# Altium footprint library con-samtec.PCBLIB: 805 footprints (part 50 of 55)
Each footprint in its own frame and in the unit in brackets; x right, y up, seen from the top. Pads: shape width x height; smd on the part's side, far side on the other; paste and mask are expansions set on the pad; w line width, h text height; cw(c..) or ccw(c..) is an arc to the next point about the centre after c.
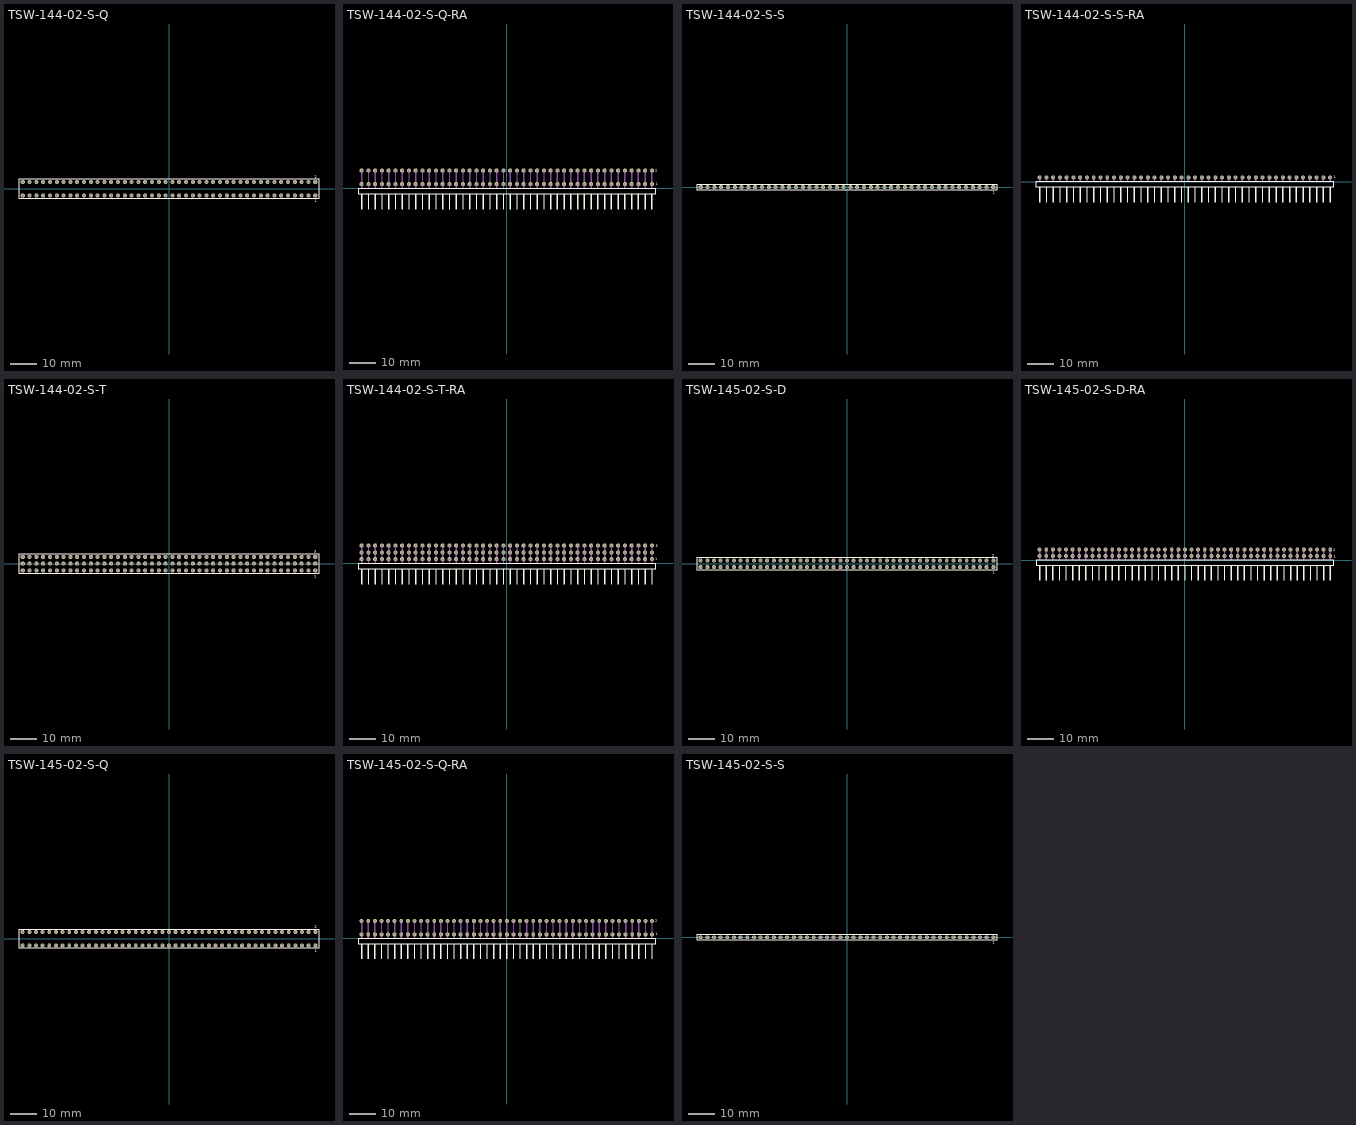
[diagram p49: the footprints below, top view; thin cyan lines are the x and y axes]

## TSW-144-02-S-Q [mm]
pads (88):
  oct 1.5x1.5 hole 1: 1(54.61,-2.54) 2(54.61,2.54) 3(52.07,-2.54) 4(52.07,2.54) 5(49.53,-2.54) 6(49.53,2.54) 7(46.99,-2.54) 8(46.99,2.54) 9(44.45,-2.54) 10(44.45,2.54) 11(41.91,-2.54) 12(41.91,2.54) 13(39.37,-2.54) 14(39.37,2.54) 15(36.83,-2.54) 16(36.83,2.54) 17(34.29,-2.54) 18(34.29,2.54) 19(31.75,-2.54) 20(31.75,2.54) 21(29.21,-2.54) 22(29.21,2.54) 23(26.67,-2.54) 24(26.67,2.54) 25(24.13,-2.54) 26(24.13,2.54) 27(21.59,-2.54) 28(21.59,2.54) 29(19.05,-2.54) 30(19.05,2.54) 31(16.51,-2.54) 32(16.51,2.54) 33(13.97,-2.54) 34(13.97,2.54) 35(11.43,-2.54) 36(11.43,2.54) 37(8.89,-2.54) 38(8.89,2.54) 39(6.35,-2.54) 40(6.35,2.54) 41(3.81,-2.54) 42(3.81,2.54) 43(1.27,-2.54) 44(1.27,2.54) 45(-1.27,-2.54) 46(-1.27,2.54) 47(-3.81,-2.54) 48(-3.81,2.54) 49(-6.35,-2.54) 50(-6.35,2.54) 51(-8.89,-2.54) 52(-8.89,2.54) 53(-11.43,-2.54) 54(-11.43,2.54) 55(-13.97,-2.54) 56(-13.97,2.54) 57(-16.51,-2.54) 58(-16.51,2.54) 59(-19.05,-2.54) 60(-19.05,2.54) 61(-21.59,-2.54) 62(-21.59,2.54) 63(-24.13,-2.54) 64(-24.13,2.54) 65(-26.67,-2.54) 66(-26.67,2.54) 67(-29.21,-2.54) 68(-29.21,2.54) 69(-31.75,-2.54) 70(-31.75,2.54) 71(-34.29,-2.54) 72(-34.29,2.54) 73(-36.83,-2.54) 74(-36.83,2.54) 75(-39.37,-2.54) 76(-39.37,2.54) 77(-41.91,-2.54) 78(-41.91,2.54) 79(-44.45,-2.54) 80(-44.45,2.54) 81(-46.99,-2.54) 82(-46.99,2.54) 83(-49.53,-2.54) 84(-49.53,2.54) 85(-52.07,-2.54) 86(-52.07,2.54) 87(-54.61,-2.54) 88(-54.61,2.54)
Top Overlay:
  lines w0.203: -56.009,-3.695 56.009,-3.695 56.009,3.695 -56.009,3.695 -56.009,-3.695
  text "1" at 54.452,-5.138 h0.94
  text "2" at 54.352,3.989 h0.94
Mechanical 16:
  rectangle: -54.96,-2.89 -54.26,-2.19
  rectangle: -54.96,2.19 -54.26,2.89
  rectangle: -52.42,-2.89 -51.72,-2.19
  rectangle: -52.42,2.19 -51.72,2.89
  rectangle: -49.88,-2.89 -49.18,-2.19
  rectangle: -49.88,2.19 -49.18,2.89
  rectangle: -47.34,-2.89 -46.64,-2.19
  rectangle: -47.34,2.19 -46.64,2.89
  rectangle: -44.8,-2.89 -44.1,-2.19
  rectangle: -44.8,2.19 -44.1,2.89
  rectangle: -42.26,-2.89 -41.56,-2.19
  rectangle: -42.26,2.19 -41.56,2.89
  rectangle: -39.72,-2.89 -39.02,-2.19
  rectangle: -39.72,2.19 -39.02,2.89
  rectangle: -37.18,-2.89 -36.48,-2.19
  rectangle: -37.18,2.19 -36.48,2.89
  rectangle: -34.64,-2.89 -33.94,-2.19
  rectangle: -34.64,2.19 -33.94,2.89
  rectangle: -32.1,-2.89 -31.4,-2.19
  rectangle: -32.1,2.19 -31.4,2.89
  rectangle: -29.56,-2.89 -28.86,-2.19
  rectangle: -29.56,2.19 -28.86,2.89
  rectangle: -27.02,-2.89 -26.32,-2.19
  rectangle: -27.02,2.19 -26.32,2.89
  rectangle: -24.48,-2.89 -23.78,-2.19
  rectangle: -24.48,2.19 -23.78,2.89
  rectangle: -21.94,-2.89 -21.24,-2.19
  rectangle: -21.94,2.19 -21.24,2.89
  rectangle: -19.4,-2.89 -18.7,-2.19
  rectangle: -19.4,2.19 -18.7,2.89
  rectangle: -16.86,-2.89 -16.16,-2.19
  rectangle: -16.86,2.19 -16.16,2.89
  rectangle: -14.32,-2.89 -13.62,-2.19
  rectangle: -14.32,2.19 -13.62,2.89
  rectangle: -11.78,-2.89 -11.08,-2.19
  rectangle: -11.78,2.19 -11.08,2.89
  rectangle: -9.24,-2.89 -8.54,-2.19
  rectangle: -9.24,2.19 -8.54,2.89
  rectangle: -6.7,-2.89 -6,-2.19
  rectangle: -6.7,2.19 -6,2.89
  rectangle: -4.16,-2.89 -3.46,-2.19
  rectangle: -4.16,2.19 -3.46,2.89
  rectangle: -1.62,-2.89 -0.92,-2.19
  rectangle: -1.62,2.19 -0.92,2.89
  rectangle: 0.92,-2.89 1.62,-2.19
  rectangle: 0.92,2.19 1.62,2.89
  rectangle: 3.46,-2.89 4.16,-2.19
  rectangle: 3.46,2.19 4.16,2.89
  rectangle: 6,-2.89 6.7,-2.19
  rectangle: 6,2.19 6.7,2.89
  rectangle: 8.54,-2.89 9.24,-2.19
  rectangle: 8.54,2.19 9.24,2.89
  rectangle: 11.08,-2.89 11.78,-2.19
  rectangle: 11.08,2.19 11.78,2.89
  rectangle: 13.62,-2.89 14.32,-2.19
  rectangle: 13.62,2.19 14.32,2.89
  rectangle: 16.16,-2.89 16.86,-2.19
  rectangle: 16.16,2.19 16.86,2.89
  rectangle: 18.7,-2.89 19.4,-2.19
  rectangle: 18.7,2.19 19.4,2.89
  rectangle: 21.24,-2.89 21.94,-2.19
  rectangle: 21.24,2.19 21.94,2.89
  rectangle: 23.78,-2.89 24.48,-2.19
  rectangle: 23.78,2.19 24.48,2.89
  rectangle: 26.32,-2.89 27.02,-2.19
  rectangle: 26.32,2.19 27.02,2.89
  rectangle: 28.86,-2.89 29.56,-2.19
  rectangle: 28.86,2.19 29.56,2.89
  rectangle: 31.4,-2.89 32.1,-2.19
  rectangle: 31.4,2.19 32.1,2.89
  rectangle: 33.94,-2.89 34.64,-2.19
  rectangle: 33.94,2.19 34.64,2.89
  rectangle: 36.48,-2.89 37.18,-2.19
  rectangle: 36.48,2.19 37.18,2.89
  rectangle: 39.02,-2.89 39.72,-2.19
  rectangle: 39.02,2.19 39.72,2.89
  rectangle: 41.56,-2.89 42.26,-2.19
  rectangle: 41.56,2.19 42.26,2.89
  rectangle: 44.1,-2.89 44.8,-2.19
  rectangle: 44.1,2.19 44.8,2.89
  rectangle: 46.64,-2.89 47.34,-2.19
  rectangle: 46.64,2.19 47.34,2.89
  rectangle: 49.18,-2.89 49.88,-2.19
  rectangle: 49.18,2.19 49.88,2.89
  rectangle: 51.72,-2.89 52.42,-2.19
  rectangle: 51.72,2.19 52.42,2.89
  rectangle: 54.26,-2.89 54.96,-2.19
  rectangle: 54.26,2.19 54.96,2.89

## TSW-144-02-S-Q-RA [mil]
pads (88):
  oct 59.06x59.06 hole 39.37: 1(2150,60) 2(2150,260) 3(2050,60) 4(2050,260) 5(1950,60) 6(1950,260) 7(1850,60) 8(1850,260) 9(1750,60) 10(1750,260) 11(1650,60) 12(1650,260) 13(1550,60) 14(1550,260) 15(1450,60) 16(1450,260) 17(1350,60) 18(1350,260) 19(1250,60) 20(1250,260) 21(1150,60) 22(1150,260) 23(1050,60) 24(1050,260) 25(950,60) 26(950,260) 27(850,60) 28(850,260) 29(750,60) 30(750,260) 31(650,60) 32(650,260) 33(550,60) 34(550,260) 35(450,60) 36(450,260) 37(350,60) 38(350,260) 39(250,60) 40(250,260) 41(150,60) 42(150,260) 43(50,60) 44(50,260) 45(-50,60) 46(-50,260) 47(-150,60) 48(-150,260) 49(-250,60) 50(-250,260) 51(-350,60) 52(-350,260) 53(-450,60) 54(-450,260) 55(-550,60) 56(-550,260) 57(-650,60) 58(-650,260) 59(-750,60) 60(-750,260) 61(-850,60) 62(-850,260) 63(-950,60) 64(-950,260) 65(-1050,60) 66(-1050,260) 67(-1150,60) 68(-1150,260) 69(-1250,60) 70(-1250,260) 71(-1350,60) 72(-1350,260) 73(-1450,60) 74(-1450,260) 75(-1550,60) 76(-1550,260) 77(-1650,60) 78(-1650,260) 79(-1750,60) 80(-1750,260) 81(-1850,60) 82(-1850,260) 83(-1950,60) 84(-1950,260) 85(-2050,60) 86(-2050,260) 87(-2150,60) 88(-2150,260)
Top Overlay:
  rectangle: -2160,-310.63 -2140,-80.32
  rectangle: -2060,-310.63 -2040,-80.32
  rectangle: -1960,-310.63 -1940,-80.32
  rectangle: -1860,-310.63 -1840,-80.32
  rectangle: -1760,-310.63 -1740,-80.32
  rectangle: -1660,-310.63 -1640,-80.32
  rectangle: -1560,-310.63 -1540,-80.32
  rectangle: -1460,-310.63 -1440,-80.32
  rectangle: -1360,-310.63 -1340,-80.32
  rectangle: -1260,-310.63 -1240,-80.32
  rectangle: -1160,-310.63 -1140,-80.32
  rectangle: -1060,-310.63 -1040,-80.32
  rectangle: -960,-310.63 -940,-80.32
  rectangle: -860,-310.63 -840,-80.32
  rectangle: -760,-310.63 -740,-80.32
  rectangle: -660,-310.63 -640,-80.32
  rectangle: -560,-310.63 -540,-80.32
  rectangle: -460,-310.63 -440,-80.32
  rectangle: -360,-310.63 -340,-80.32
  rectangle: -260,-310.63 -240,-80.32
  rectangle: -160,-310.63 -140,-80.32
  rectangle: -60,-310.63 -40,-80.32
  rectangle: 40,-310.63 60,-80.32
  rectangle: 140,-310.63 160,-80.32
  rectangle: 240,-310.63 260,-80.32
  rectangle: 340,-310.63 360,-80.32
  rectangle: 440,-310.63 460,-80.32
  rectangle: 540,-310.63 560,-80.32
  rectangle: 640,-310.63 660,-80.32
  rectangle: 740,-310.63 760,-80.32
  rectangle: 840,-310.63 860,-80.32
  rectangle: 940,-310.63 960,-80.32
  rectangle: 1040,-310.63 1060,-80.32
  rectangle: 1140,-310.63 1160,-80.32
  rectangle: 1240,-310.63 1260,-80.32
  rectangle: 1340,-310.63 1360,-80.32
  rectangle: 1440,-310.63 1460,-80.32
  rectangle: 1540,-310.63 1560,-80.32
  rectangle: 1640,-310.63 1660,-80.32
  rectangle: 1740,-310.63 1760,-80.32
  rectangle: 1840,-310.63 1860,-80.32
  rectangle: 1940,-310.63 1960,-80.32
  rectangle: 2040,-310.63 2060,-80.32
  rectangle: 2140,-310.63 2160,-80.32
  lines w8: -2205.08,-80.55 2205.08,-80.55 2205.08,-4.17 -2205.08,-4.17 -2205.08,-80.55
  text "1" at 2203.54,43.31 h36.81
  text "2" at 2201.18,242.72 h36.81
Mechanical 16:
  rectangle: -2160,0 -2140,270
  rectangle: -2060,0 -2040,270
  rectangle: -1960,0 -1940,270
  rectangle: -1860,0 -1840,270
  rectangle: -1760,0 -1740,270
  rectangle: -1660,0 -1640,270
  rectangle: -1560,0 -1540,270
  rectangle: -1460,0 -1440,270
  rectangle: -1360,0 -1340,270
  rectangle: -1260,0 -1240,270
  rectangle: -1160,0 -1140,270
  rectangle: -1060,0 -1040,270
  rectangle: -960,0 -940,270
  rectangle: -860,0 -840,270
  rectangle: -760,0 -740,270
  rectangle: -660,0 -640,270
  rectangle: -560,0 -540,270
  rectangle: -460,0 -440,270
  rectangle: -360,0 -340,270
  rectangle: -260,0 -240,270
  rectangle: -160,0 -140,270
  rectangle: -60,0 -40,270
  rectangle: 40,0 60,270
  rectangle: 140,0 160,270
  rectangle: 240,0 260,270
  rectangle: 340,0 360,270
  rectangle: 440,0 460,270
  rectangle: 540,0 560,270
  rectangle: 640,0 660,270
  rectangle: 740,0 760,270
  rectangle: 840,0 860,270
  rectangle: 940,0 960,270
  rectangle: 1040,0 1060,270
  rectangle: 1140,0 1160,270
  rectangle: 1240,0 1260,270
  rectangle: 1340,0 1360,270
  rectangle: 1440,0 1460,270
  rectangle: 1540,0 1560,270
  rectangle: 1640,0 1660,270
  rectangle: 1740,0 1760,270
  rectangle: 1840,0 1860,270
  rectangle: 1940,0 1960,270
  rectangle: 2040,0 2060,270
  rectangle: 2140,0 2160,270

## TSW-144-02-S-S [mm]
pads (44):
  oct 1.5x1.5 hole 1: 1(54.61,0) 2(52.07,0) 3(49.53,0) 4(46.99,0) 5(44.45,0) 6(41.91,0) 7(39.37,0) 8(36.83,0) 9(34.29,0) 10(31.75,0) 11(29.21,0) 12(26.67,0) 13(24.13,0) 14(21.59,0) 15(19.05,0) 16(16.51,0) 17(13.97,0) 18(11.43,0) 19(8.89,0) 20(6.35,0) 21(3.81,0) 22(1.27,0) 23(-1.27,0) 24(-3.81,0) 25(-6.35,0) 26(-8.89,0) 27(-11.43,0) 28(-13.97,0) 29(-16.51,0) 30(-19.05,0) 31(-21.59,0) 32(-24.13,0) 33(-26.67,0) 34(-29.21,0) 35(-31.75,0) 36(-34.29,0) 37(-36.83,0) 38(-39.37,0) 39(-41.91,0) 40(-44.45,0) 41(-46.99,0) 42(-49.53,0) 43(-52.07,0) 44(-54.61,0)
Top Overlay:
  lines w0.203: -56.009,-1.155 56.009,-1.155 56.009,1.155 -56.009,1.155 -56.009,-1.155
  text "1" at 54.352,-2.498 h0.94
Mechanical 16:
  rectangle: -54.96,-0.35 -54.26,0.35
  rectangle: -52.42,-0.35 -51.72,0.35
  rectangle: -49.88,-0.35 -49.18,0.35
  rectangle: -47.34,-0.35 -46.64,0.35
  rectangle: -44.8,-0.35 -44.1,0.35
  rectangle: -42.26,-0.35 -41.56,0.35
  rectangle: -39.72,-0.35 -39.02,0.35
  rectangle: -37.18,-0.35 -36.48,0.35
  rectangle: -34.64,-0.35 -33.94,0.35
  rectangle: -32.1,-0.35 -31.4,0.35
  rectangle: -29.56,-0.35 -28.86,0.35
  rectangle: -27.02,-0.35 -26.32,0.35
  rectangle: -24.48,-0.35 -23.78,0.35
  rectangle: -21.94,-0.35 -21.24,0.35
  rectangle: -19.4,-0.35 -18.7,0.35
  rectangle: -16.86,-0.35 -16.16,0.35
  rectangle: -14.32,-0.35 -13.62,0.35
  rectangle: -11.78,-0.35 -11.08,0.35
  rectangle: -9.24,-0.35 -8.54,0.35
  rectangle: -6.7,-0.35 -6,0.35
  rectangle: -4.16,-0.35 -3.46,0.35
  rectangle: -1.62,-0.35 -0.92,0.35
  rectangle: 0.92,-0.35 1.62,0.35
  rectangle: 3.46,-0.35 4.16,0.35
  rectangle: 6,-0.35 6.7,0.35
  rectangle: 8.54,-0.35 9.24,0.35
  rectangle: 11.08,-0.35 11.78,0.35
  rectangle: 13.62,-0.35 14.32,0.35
  rectangle: 16.16,-0.35 16.86,0.35
  rectangle: 18.7,-0.35 19.4,0.35
  rectangle: 21.24,-0.35 21.94,0.35
  rectangle: 23.78,-0.35 24.48,0.35
  rectangle: 26.32,-0.35 27.02,0.35
  rectangle: 28.86,-0.35 29.56,0.35
  rectangle: 31.4,-0.35 32.1,0.35
  rectangle: 33.94,-0.35 34.64,0.35
  rectangle: 36.48,-0.35 37.18,0.35
  rectangle: 39.02,-0.35 39.72,0.35
  rectangle: 41.56,-0.35 42.26,0.35
  rectangle: 44.1,-0.35 44.8,0.35
  rectangle: 46.64,-0.35 47.34,0.35
  rectangle: 49.18,-0.35 49.88,0.35
  rectangle: 51.72,-0.35 52.42,0.35
  rectangle: 54.26,-0.35 54.96,0.35

## TSW-144-02-S-S-RA [mil]
pads (44):
  oct 59.06x59.06 hole 39.37: 1(2150,60) 2(2050,60) 3(1950,60) 4(1850,60) 5(1750,60) 6(1650,60) 7(1550,60) 8(1450,60) 9(1350,60) 10(1250,60) 11(1150,60) 12(1050,60) 13(950,60) 14(850,60) 15(750,60) 16(650,60) 17(550,60) 18(450,60) 19(350,60) 20(250,60) 21(150,60) 22(50,60) 23(-50,60) 24(-150,60) 25(-250,60) 26(-350,60) 27(-450,60) 28(-550,60) 29(-650,60) 30(-750,60) 31(-850,60) 32(-950,60) 33(-1050,60) 34(-1150,60) 35(-1250,60) 36(-1350,60) 37(-1450,60) 38(-1550,60) 39(-1650,60) 40(-1750,60) 41(-1850,60) 42(-1950,60) 43(-2050,60) 44(-2150,60)
Top Overlay:
  rectangle: -2160,-310.63 -2140,-80.32
  rectangle: -2060,-310.63 -2040,-80.32
  rectangle: -1960,-310.63 -1940,-80.32
  rectangle: -1860,-310.63 -1840,-80.32
  rectangle: -1760,-310.63 -1740,-80.32
  rectangle: -1660,-310.63 -1640,-80.32
  rectangle: -1560,-310.63 -1540,-80.32
  rectangle: -1460,-310.63 -1440,-80.32
  rectangle: -1360,-310.63 -1340,-80.32
  rectangle: -1260,-310.63 -1240,-80.32
  rectangle: -1160,-310.63 -1140,-80.32
  rectangle: -1060,-310.63 -1040,-80.32
  rectangle: -960,-310.63 -940,-80.32
  rectangle: -860,-310.63 -840,-80.32
  rectangle: -760,-310.63 -740,-80.32
  rectangle: -660,-310.63 -640,-80.32
  rectangle: -560,-310.63 -540,-80.32
  rectangle: -460,-310.63 -440,-80.32
  rectangle: -360,-310.63 -340,-80.32
  rectangle: -260,-310.63 -240,-80.32
  rectangle: -160,-310.63 -140,-80.32
  rectangle: -60,-310.63 -40,-80.32
  rectangle: 40,-310.63 60,-80.32
  rectangle: 140,-310.63 160,-80.32
  rectangle: 240,-310.63 260,-80.32
  rectangle: 340,-310.63 360,-80.32
  rectangle: 440,-310.63 460,-80.32
  rectangle: 540,-310.63 560,-80.32
  rectangle: 640,-310.63 660,-80.32
  rectangle: 740,-310.63 760,-80.32
  rectangle: 840,-310.63 860,-80.32
  rectangle: 940,-310.63 960,-80.32
  rectangle: 1040,-310.63 1060,-80.32
  rectangle: 1140,-310.63 1160,-80.32
  rectangle: 1240,-310.63 1260,-80.32
  rectangle: 1340,-310.63 1360,-80.32
  rectangle: 1440,-310.63 1460,-80.32
  rectangle: 1540,-310.63 1560,-80.32
  rectangle: 1640,-310.63 1660,-80.32
  rectangle: 1740,-310.63 1760,-80.32
  rectangle: 1840,-310.63 1860,-80.32
  rectangle: 1940,-310.63 1960,-80.32
  rectangle: 2040,-310.63 2060,-80.32
  rectangle: 2140,-310.63 2160,-80.32
  lines w8: -2205.08,-80.55 2205.08,-80.55 2205.08,-4.17 -2205.08,-4.17 -2205.08,-80.55
  text "1" at 2200.47,45.35 h36.81
Mechanical 16:
  rectangle: -2160,0 -2140,70
  rectangle: -2060,0 -2040,70
  rectangle: -1960,0 -1940,70
  rectangle: -1860,0 -1840,70
  rectangle: -1760,0 -1740,70
  rectangle: -1660,0 -1640,70
  rectangle: -1560,0 -1540,70
  rectangle: -1460,0 -1440,70
  rectangle: -1360,0 -1340,70
  rectangle: -1260,0 -1240,70
  rectangle: -1160,0 -1140,70
  rectangle: -1060,0 -1040,70
  rectangle: -960,0 -940,70
  rectangle: -860,0 -840,70
  rectangle: -760,0 -740,70
  rectangle: -660,0 -640,70
  rectangle: -560,0 -540,70
  rectangle: -460,0 -440,70
  rectangle: -360,0 -340,70
  rectangle: -260,0 -240,70
  rectangle: -160,0 -140,70
  rectangle: -60,0 -40,70
  rectangle: 40,0 60,70
  rectangle: 140,0 160,70
  rectangle: 240,0 260,70
  rectangle: 340,0 360,70
  rectangle: 440,0 460,70
  rectangle: 540,0 560,70
  rectangle: 640,0 660,70
  rectangle: 740,0 760,70
  rectangle: 840,0 860,70
  rectangle: 940,0 960,70
  rectangle: 1040,0 1060,70
  rectangle: 1140,0 1160,70
  rectangle: 1240,0 1260,70
  rectangle: 1340,0 1360,70
  rectangle: 1440,0 1460,70
  rectangle: 1540,0 1560,70
  rectangle: 1640,0 1660,70
  rectangle: 1740,0 1760,70
  rectangle: 1840,0 1860,70
  rectangle: 1940,0 1960,70
  rectangle: 2040,0 2060,70
  rectangle: 2140,0 2160,70

## TSW-144-02-S-T [mm]
pads (132):
  oct 1.5x1.5 hole 1: 1(54.61,-2.54) 2(54.61,0) 3(54.61,2.54) 4(52.07,-2.54) 5(52.07,0) 6(52.07,2.54) 7(49.53,-2.54) 8(49.53,0) 9(49.53,2.54) 10(46.99,-2.54) 11(46.99,0) 12(46.99,2.54) 13(44.45,-2.54) 14(44.45,0) 15(44.45,2.54) 16(41.91,-2.54) 17(41.91,0) 18(41.91,2.54) 19(39.37,-2.54) 20(39.37,0) 21(39.37,2.54) 22(36.83,-2.54) 23(36.83,0) 24(36.83,2.54) 25(34.29,-2.54) 26(34.29,0) 27(34.29,2.54) 28(31.75,-2.54) 29(31.75,0) 30(31.75,2.54) 31(29.21,-2.54) 32(29.21,0) 33(29.21,2.54) 34(26.67,-2.54) 35(26.67,0) 36(26.67,2.54) 37(24.13,-2.54) 38(24.13,0) 39(24.13,2.54) 40(21.59,-2.54) 41(21.59,0) 42(21.59,2.54) 43(19.05,-2.54) 44(19.05,0) 45(19.05,2.54) 46(16.51,-2.54) 47(16.51,0) 48(16.51,2.54) 49(13.97,-2.54) 50(13.97,0) 51(13.97,2.54) 52(11.43,-2.54) 53(11.43,0) 54(11.43,2.54) 55(8.89,-2.54) 56(8.89,0) 57(8.89,2.54) 58(6.35,-2.54) 59(6.35,0) 60(6.35,2.54) 61(3.81,-2.54) 62(3.81,0) 63(3.81,2.54) 64(1.27,-2.54) 65(1.27,0) 66(1.27,2.54) 67(-1.27,-2.54) 68(-1.27,0) 69(-1.27,2.54) 70(-3.81,-2.54) 71(-3.81,0) 72(-3.81,2.54) 73(-6.35,-2.54) 74(-6.35,0) 75(-6.35,2.54) 76(-8.89,-2.54) 77(-8.89,0) 78(-8.89,2.54) 79(-11.43,-2.54) 80(-11.43,0) 81(-11.43,2.54) 82(-13.97,-2.54) 83(-13.97,0) 84(-13.97,2.54) 85(-16.51,-2.54) 86(-16.51,0) 87(-16.51,2.54) 88(-19.05,-2.54) 89(-19.05,0) 90(-19.05,2.54) 91(-21.59,-2.54) 92(-21.59,0) 93(-21.59,2.54) 94(-24.13,-2.54) 95(-24.13,0) 96(-24.13,2.54) 97(-26.67,-2.54) 98(-26.67,0) 99(-26.67,2.54) 100(-29.21,-2.54) 101(-29.21,0) 102(-29.21,2.54) 103(-31.75,-2.54) 104(-31.75,0) 105(-31.75,2.54) 106(-34.29,-2.54) 107(-34.29,0) 108(-34.29,2.54) 109(-36.83,-2.54) 110(-36.83,0) 111(-36.83,2.54) 112(-39.37,-2.54) 113(-39.37,0) 114(-39.37,2.54) 115(-41.91,-2.54) 116(-41.91,0) 117(-41.91,2.54) 118(-44.45,-2.54) 119(-44.45,0) 120(-44.45,2.54) 121(-46.99,-2.54) 122(-46.99,0) 123(-46.99,2.54) 124(-49.53,-2.54) 125(-49.53,0) 126(-49.53,2.54) 127(-52.07,-2.54) 128(-52.07,0) 129(-52.07,2.54) 130(-54.61,-2.54) 131(-54.61,0) 132(-54.61,2.54)
Top Overlay:
  lines w0.203: -56.009,-3.695 56.009,-3.695 56.009,3.695 -56.009,3.695 -56.009,-3.695
  text "1" at 54.302,-5.188 h0.94
  text "3" at 54.298,3.989 h0.94
Mechanical 16:
  rectangle: -54.96,-2.89 -54.26,-2.19
  rectangle: -54.96,-0.35 -54.26,0.35
  rectangle: -54.96,2.19 -54.26,2.89
  rectangle: -52.42,-2.89 -51.72,-2.19
  rectangle: -52.42,-0.35 -51.72,0.35
  rectangle: -52.42,2.19 -51.72,2.89
  rectangle: -49.88,-2.89 -49.18,-2.19
  rectangle: -49.88,-0.35 -49.18,0.35
  rectangle: -49.88,2.19 -49.18,2.89
  rectangle: -47.34,-2.89 -46.64,-2.19
  rectangle: -47.34,-0.35 -46.64,0.35
  rectangle: -47.34,2.19 -46.64,2.89
  rectangle: -44.8,-2.89 -44.1,-2.19
  rectangle: -44.8,-0.35 -44.1,0.35
  rectangle: -44.8,2.19 -44.1,2.89
  rectangle: -42.26,-2.89 -41.56,-2.19
  rectangle: -42.26,-0.35 -41.56,0.35
  rectangle: -42.26,2.19 -41.56,2.89
  rectangle: -39.72,-2.89 -39.02,-2.19
  rectangle: -39.72,-0.35 -39.02,0.35
  rectangle: -39.72,2.19 -39.02,2.89
  rectangle: -37.18,-2.89 -36.48,-2.19
  rectangle: -37.18,-0.35 -36.48,0.35
  rectangle: -37.18,2.19 -36.48,2.89
  rectangle: -34.64,-2.89 -33.94,-2.19
  rectangle: -34.64,-0.35 -33.94,0.35
  rectangle: -34.64,2.19 -33.94,2.89
  rectangle: -32.1,-2.89 -31.4,-2.19
  rectangle: -32.1,-0.35 -31.4,0.35
  rectangle: -32.1,2.19 -31.4,2.89
  rectangle: -29.56,-2.89 -28.86,-2.19
  rectangle: -29.56,-0.35 -28.86,0.35
  rectangle: -29.56,2.19 -28.86,2.89
  rectangle: -27.02,-2.89 -26.32,-2.19
  rectangle: -27.02,-0.35 -26.32,0.35
  rectangle: -27.02,2.19 -26.32,2.89
  rectangle: -24.48,-2.89 -23.78,-2.19
  rectangle: -24.48,-0.35 -23.78,0.35
  rectangle: -24.48,2.19 -23.78,2.89
  rectangle: -21.94,-2.89 -21.24,-2.19
  rectangle: -21.94,-0.35 -21.24,0.35
  rectangle: -21.94,2.19 -21.24,2.89
  rectangle: -19.4,-2.89 -18.7,-2.19
  rectangle: -19.4,-0.35 -18.7,0.35
  rectangle: -19.4,2.19 -18.7,2.89
  rectangle: -16.86,-2.89 -16.16,-2.19
  rectangle: -16.86,-0.35 -16.16,0.35
  rectangle: -16.86,2.19 -16.16,2.89
  rectangle: -14.32,-2.89 -13.62,-2.19
  rectangle: -14.32,-0.35 -13.62,0.35
  rectangle: -14.32,2.19 -13.62,2.89
  rectangle: -11.78,-2.89 -11.08,-2.19
  rectangle: -11.78,-0.35 -11.08,0.35
  rectangle: -11.78,2.19 -11.08,2.89
  rectangle: -9.24,-2.89 -8.54,-2.19
  rectangle: -9.24,-0.35 -8.54,0.35
  rectangle: -9.24,2.19 -8.54,2.89
  rectangle: -6.7,-2.89 -6,-2.19
  rectangle: -6.7,-0.35 -6,0.35
  rectangle: -6.7,2.19 -6,2.89
  rectangle: -4.16,-2.89 -3.46,-2.19
  rectangle: -4.16,-0.35 -3.46,0.35
  rectangle: -4.16,2.19 -3.46,2.89
  rectangle: -1.62,-2.89 -0.92,-2.19
  rectangle: -1.62,-0.35 -0.92,0.35
  rectangle: -1.62,2.19 -0.92,2.89
  rectangle: 0.92,-2.89 1.62,-2.19
  rectangle: 0.92,-0.35 1.62,0.35
  rectangle: 0.92,2.19 1.62,2.89
  rectangle: 3.46,-2.89 4.16,-2.19
  rectangle: 3.46,-0.35 4.16,0.35
  rectangle: 3.46,2.19 4.16,2.89
  rectangle: 6,-2.89 6.7,-2.19
  rectangle: 6,-0.35 6.7,0.35
  rectangle: 6,2.19 6.7,2.89
  rectangle: 8.54,-2.89 9.24,-2.19
  rectangle: 8.54,-0.35 9.24,0.35
  rectangle: 8.54,2.19 9.24,2.89
  rectangle: 11.08,-2.89 11.78,-2.19
  rectangle: 11.08,-0.35 11.78,0.35
  rectangle: 11.08,2.19 11.78,2.89
  rectangle: 13.62,-2.89 14.32,-2.19
  rectangle: 13.62,-0.35 14.32,0.35
  rectangle: 13.62,2.19 14.32,2.89
  rectangle: 16.16,-2.89 16.86,-2.19
  rectangle: 16.16,-0.35 16.86,0.35
  rectangle: 16.16,2.19 16.86,2.89
  rectangle: 18.7,-2.89 19.4,-2.19
  rectangle: 18.7,-0.35 19.4,0.35
  rectangle: 18.7,2.19 19.4,2.89
  rectangle: 21.24,-2.89 21.94,-2.19
  rectangle: 21.24,-0.35 21.94,0.35
  rectangle: 21.24,2.19 21.94,2.89
  rectangle: 23.78,-2.89 24.48,-2.19
  rectangle: 23.78,-0.35 24.48,0.35
  rectangle: 23.78,2.19 24.48,2.89
  rectangle: 26.32,-2.89 27.02,-2.19
  rectangle: 26.32,-0.35 27.02,0.35
  rectangle: 26.32,2.19 27.02,2.89
  rectangle: 28.86,-2.89 29.56,-2.19
  rectangle: 28.86,-0.35 29.56,0.35
  rectangle: 28.86,2.19 29.56,2.89
  rectangle: 31.4,-2.89 32.1,-2.19
  rectangle: 31.4,-0.35 32.1,0.35
  rectangle: 31.4,2.19 32.1,2.89
  rectangle: 33.94,-2.89 34.64,-2.19
  rectangle: 33.94,-0.35 34.64,0.35
  rectangle: 33.94,2.19 34.64,2.89
  rectangle: 36.48,-2.89 37.18,-2.19
  rectangle: 36.48,-0.35 37.18,0.35
  rectangle: 36.48,2.19 37.18,2.89
  rectangle: 39.02,-2.89 39.72,-2.19
  rectangle: 39.02,-0.35 39.72,0.35
  rectangle: 39.02,2.19 39.72,2.89
  rectangle: 41.56,-2.89 42.26,-2.19
  rectangle: 41.56,-0.35 42.26,0.35
  rectangle: 41.56,2.19 42.26,2.89
  rectangle: 44.1,-2.89 44.8,-2.19
  rectangle: 44.1,-0.35 44.8,0.35
  rectangle: 44.1,2.19 44.8,2.89
  rectangle: 46.64,-2.89 47.34,-2.19
  rectangle: 46.64,-0.35 47.34,0.35
  rectangle: 46.64,2.19 47.34,2.89
  rectangle: 49.18,-2.89 49.88,-2.19
  rectangle: 49.18,-0.35 49.88,0.35
  rectangle: 49.18,2.19 49.88,2.89
  rectangle: 51.72,-2.89 52.42,-2.19
  rectangle: 51.72,-0.35 52.42,0.35
  rectangle: 51.72,2.19 52.42,2.89
  rectangle: 54.26,-2.89 54.96,-2.19
  rectangle: 54.26,-0.35 54.96,0.35
  rectangle: 54.26,2.19 54.96,2.89
